# Altium schematic symbol library jlcpcb_2025_04_capacitors_extended_0805.schlib: 3281 symbols (part 17 of 18) (continued)
## TCC0805X5R395K250FT
designator C?  Capacitance: 3.9uF  (hidden comment: *)
Capacitor, Ceramic (MLCC), 3.9uF, ±10%, 25V, X5R, ±10%, SMD 0805; Manufacturer: CCTC; Manufacturer Part Number: TCC0805X5R395K250FT; Package Size: 0805; JLCPCB Basic Part: No; JLCPCB Part Number: C7393929; Supplier 1: LCSC; Category: Capacitors - MLCC; Supplier Part Number 1: C7393929; Tolerance: ±10%; Voltage Rating: 25V; Temperature Coefficient: X5R; RoHS: Yes; ComponentLink1Description: Datasheet; ComponentLink1URL: https://wmsc.lcsc.com/wmsc/upload/file/pdf/v2/lcsc/2306211554_CCTC-TCC0805X5R395K250FT_C7393929.pdf; ComponentLink2Description: JLCPCB Part URL; ComponentLink2URL: https://jlcpcb.com/partdetail/C7393929; ComponentLink3Description: LCSC Part URL; ComponentLink3URL: https://lcsc.com/product-detail/Multilayer-Ceramic-Capacitors-MLCC---SMD-SMT_CCTC-CCTC-TCC0805X5R395K250FT_C7393929.html
footprint CAP-0805 (0805 (2012M) Capacitor)
pins: 1, 2

## TCC0805X5R475K100FT
designator C?  Capacitance: 4.7uF  (hidden comment: *)
Capacitor, Ceramic (MLCC), 4.7uF, ±10%, 10V, X5R, ±10%, SMD 0805; Manufacturer: CCTC; Manufacturer Part Number: TCC0805X5R475K100FT; Package Size: 0805; JLCPCB Basic Part: No; JLCPCB Part Number: C380341; Supplier 1: LCSC; Category: Capacitors - MLCC; Supplier Part Number 1: C380341; Tolerance: ±10%; Voltage Rating: 10V; Temperature Coefficient: X5R; RoHS: Yes; ComponentLink1Description: Datasheet; ComponentLink1URL: https://wmsc.lcsc.com/wmsc/upload/file/pdf/v2/lcsc/2304140030_CCTC-TCC0805X5R475K100FT_C380341.pdf; ComponentLink2Description: JLCPCB Part URL; ComponentLink2URL: https://jlcpcb.com/partdetail/C380341; ComponentLink3Description: LCSC Part URL; ComponentLink3URL: https://lcsc.com/product-detail/Multilayer-Ceramic-Capacitors-MLCC---SMD-SMT_CCTC-CCTC-TCC0805X5R475K100FT_C380341.html
footprint CAP-0805 (0805 (2012M) Capacitor)
pins: 1, 2

## TCC0805X5R475K160FT
designator C?  Capacitance: 4.7uF  (hidden comment: *)
Capacitor, Ceramic (MLCC), 4.7uF, ±10%, 16V, X5R, ±10%, SMD 0805; Manufacturer: CCTC; Manufacturer Part Number: TCC0805X5R475K160FT; Package Size: 0805; JLCPCB Basic Part: No; JLCPCB Part Number: C380342; Supplier 1: LCSC; Category: Capacitors - MLCC; Supplier Part Number 1: C380342; Tolerance: ±10%; Voltage Rating: 16V; Temperature Coefficient: X5R; RoHS: Yes; ComponentLink1Description: Datasheet; ComponentLink1URL: https://wmsc.lcsc.com/wmsc/upload/file/pdf/v2/lcsc/2304140030_CCTC-TCC0805X5R475K160FT_C380342.pdf; ComponentLink2Description: JLCPCB Part URL; ComponentLink2URL: https://jlcpcb.com/partdetail/C380342; ComponentLink3Description: LCSC Part URL; ComponentLink3URL: https://lcsc.com/product-detail/Multilayer-Ceramic-Capacitors-MLCC---SMD-SMT_CCTC-CCTC-TCC0805X5R475K160FT_C380342.html
footprint CAP-0805 (0805 (2012M) Capacitor)
pins: 1, 2

## TCC0805X5R475K250FT
designator C?  Capacitance: 4.7uF  (hidden comment: *)
Capacitor, Ceramic (MLCC), 4.7uF, ±10%, 25V, X5R, ±10%, SMD 0805; Manufacturer: CCTC; Manufacturer Part Number: TCC0805X5R475K250FT; Package Size: 0805; JLCPCB Basic Part: No; JLCPCB Part Number: C380343; Supplier 1: LCSC; Category: Capacitors - MLCC; Supplier Part Number 1: C380343; Tolerance: ±10%; Voltage Rating: 25V; Temperature Coefficient: X5R; RoHS: Yes; ComponentLink1Description: Datasheet; ComponentLink1URL: https://wmsc.lcsc.com/wmsc/upload/file/pdf/v2/lcsc/2304140030_CCTC-TCC0805X5R475K250FT_C380343.pdf; ComponentLink2Description: JLCPCB Part URL; ComponentLink2URL: https://jlcpcb.com/partdetail/C380343; ComponentLink3Description: LCSC Part URL; ComponentLink3URL: https://lcsc.com/product-detail/Multilayer-Ceramic-Capacitors-MLCC---SMD-SMT_CCTC-CCTC-TCC0805X5R475K250FT_C380343.html
footprint CAP-0805 (0805 (2012M) Capacitor)
pins: 1, 2

## TCC0805X5R475K500FT
designator C?  Capacitance: 4.7uF  (hidden comment: *)
Capacitor, Ceramic (MLCC), 4.7uF, ±10%, 50V, X5R, ±10%, SMD 0805; Manufacturer: CCTC; Manufacturer Part Number: TCC0805X5R475K500FT; Package Size: 0805; JLCPCB Basic Part: No; JLCPCB Part Number: C2903668; Supplier 1: LCSC; Category: Capacitors - MLCC; Supplier Part Number 1: C2903668; Tolerance: ±10%; Voltage Rating: 50V; Temperature Coefficient: X5R; RoHS: Yes; ComponentLink1Description: Datasheet; ComponentLink1URL: https://wmsc.lcsc.com/wmsc/upload/file/pdf/v2/lcsc/2110101130_CCTC-TCC0805X5R475K500FT_C2903668.pdf; ComponentLink2Description: JLCPCB Part URL; ComponentLink2URL: https://jlcpcb.com/partdetail/C2903668; ComponentLink3Description: LCSC Part URL; ComponentLink3URL: https://lcsc.com/product-detail/Multilayer-Ceramic-Capacitors-MLCC---SMD-SMT_CCTC-CCTC-TCC0805X5R475K500FT_C2903668.html
footprint CAP-0805 (0805 (2012M) Capacitor)
pins: 1, 2

## TCC0805X5R475M250FT
designator C?  Capacitance: 4.7uF  (hidden comment: *)
Capacitor, Ceramic (MLCC), 4.7uF, ±20%, 25V, X5R, ±20%, SMD 0805; Manufacturer: CCTC; Manufacturer Part Number: TCC0805X5R475M250FT; Package Size: 0805; JLCPCB Basic Part: No; JLCPCB Part Number: C5375826; Supplier 1: LCSC; Category: Capacitors - MLCC; Supplier Part Number 1: C5375826; Tolerance: ±20%; Voltage Rating: 25V; Temperature Coefficient: X5R; RoHS: Yes; ComponentLink1Description: Datasheet; ComponentLink2Description: JLCPCB Part URL; ComponentLink2URL: https://jlcpcb.com/partdetail/C5375826; ComponentLink3Description: LCSC Part URL; ComponentLink3URL: https://lcsc.com/product-detail/Multilayer-Ceramic-Capacitors-MLCC---SMD-SMT_CCTC-CCTC-TCC0805X5R475M250FT_C5375826.html
footprint CAP-0805 (0805 (2012M) Capacitor)
pins: 1, 2

## TCC0805X5R475M500FT
designator C?  Capacitance: 4.7uF  (hidden comment: *)
Capacitor, Ceramic (MLCC), 4.7uF, ±20%, 50V, X5R, ±20%, SMD 0805; Manufacturer: CCTC; Manufacturer Part Number: TCC0805X5R475M500FT; Package Size: 0805; JLCPCB Basic Part: No; JLCPCB Part Number: C7393930; Supplier 1: LCSC; Category: Capacitors - MLCC; Supplier Part Number 1: C7393930; Tolerance: ±20%; Voltage Rating: 50V; Temperature Coefficient: X5R; RoHS: Yes; ComponentLink1Description: Datasheet; ComponentLink1URL: https://wmsc.lcsc.com/wmsc/upload/file/pdf/v2/lcsc/2306211554_CCTC-TCC0805X5R475M500FT_C7393930.pdf; ComponentLink2Description: JLCPCB Part URL; ComponentLink2URL: https://jlcpcb.com/partdetail/C7393930; ComponentLink3Description: LCSC Part URL; ComponentLink3URL: https://lcsc.com/product-detail/Multilayer-Ceramic-Capacitors-MLCC---SMD-SMT_CCTC-CCTC-TCC0805X5R475M500FT_C7393930.html
footprint CAP-0805 (0805 (2012M) Capacitor)
pins: 1, 2

## TCC0805X7R101K500BT
designator C?  Capacitance: 100pF  (hidden comment: *)
Capacitor, Ceramic (MLCC), 100pF, ±10%, 50V, X7R, ±10%, SMD 0805; Manufacturer: CCTC; Manufacturer Part Number: TCC0805X7R101K500BT; Package Size: 0805; JLCPCB Basic Part: No; JLCPCB Part Number: C376914; Supplier 1: LCSC; Category: Capacitors - MLCC; Supplier Part Number 1: C376914; Tolerance: ±10%; Voltage Rating: 50V; Temperature Coefficient: X7R; RoHS: Yes; ComponentLink1Description: Datasheet; ComponentLink1URL: https://wmsc.lcsc.com/wmsc/upload/file/pdf/v2/lcsc/2304140030_CCTC-TCC0805X7R101K500BT_C376914.pdf; ComponentLink2Description: JLCPCB Part URL; ComponentLink2URL: https://jlcpcb.com/partdetail/C376914; ComponentLink3Description: LCSC Part URL; ComponentLink3URL: https://lcsc.com/product-detail/Multilayer-Ceramic-Capacitors-MLCC---SMD-SMT_CCTC-CCTC-TCC0805X7R101K500BT_C376914.html
footprint CAP-0805 (0805 (2012M) Capacitor)
pins: 1, 2

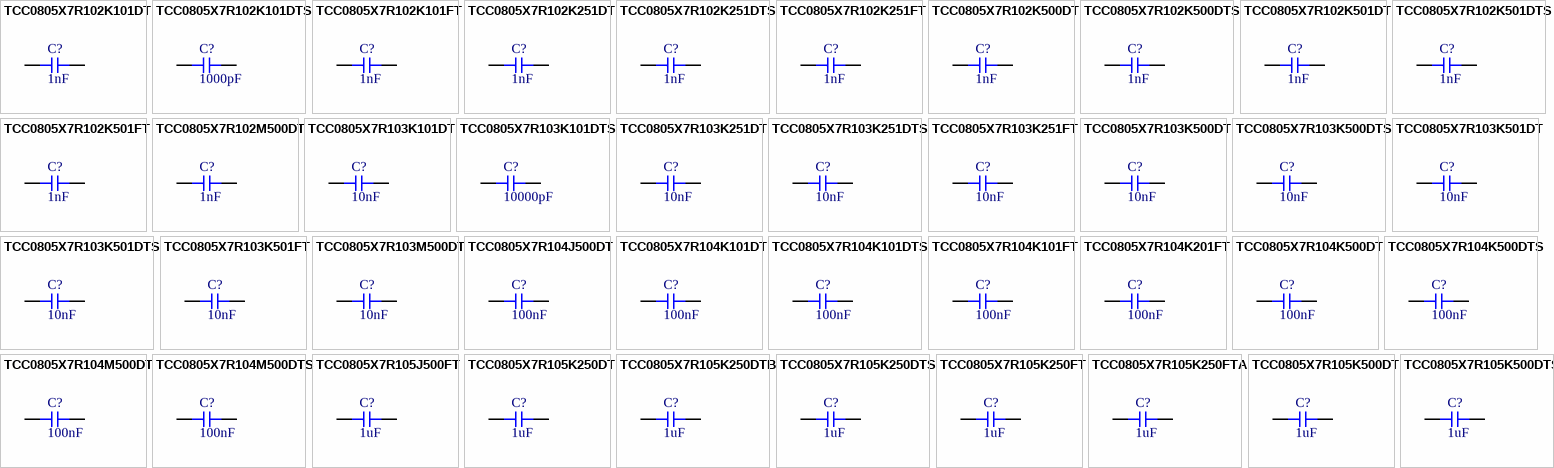
[diagram p76: symbols TCC0805X7R102K101DT to TCC0805X7R105K500DTS]

## TCC0805X7R102K101DT
designator C?  Capacitance: 1nF  (hidden comment: *)
Capacitor, Ceramic (MLCC), 1nF, ±10%, 100V, X7R, ±10%, SMD 0805; Manufacturer: CCTC; Manufacturer Part Number: TCC0805X7R102K101DT; Package Size: 0805; JLCPCB Basic Part: No; JLCPCB Part Number: C282718; Supplier 1: LCSC; Category: Capacitors - MLCC; Supplier Part Number 1: C282718; Tolerance: ±10%; Voltage Rating: 100V; Temperature Coefficient: X7R; RoHS: Yes; ComponentLink1Description: Datasheet; ComponentLink1URL: https://wmsc.lcsc.com/wmsc/upload/file/pdf/v2/lcsc/2304140030_CCTC-TCC0805X7R102K101DT_C282718.pdf; ComponentLink2Description: JLCPCB Part URL; ComponentLink2URL: https://jlcpcb.com/partdetail/C282718; ComponentLink3Description: LCSC Part URL; ComponentLink3URL: https://lcsc.com/product-detail/Multilayer-Ceramic-Capacitors-MLCC---SMD-SMT_CCTC-CCTC-TCC0805X7R102K101DT_C282718.html
footprint CAP-0805 (0805 (2012M) Capacitor)
pins: 1, 2

## TCC0805X7R102K101DTS
designator C?  Capacitance: 1000pF  (hidden comment: *)
Capacitor, Ceramic (MLCC), 1000pF, ±10%, 100V, X7R, ±10%, SMD 0805; Manufacturer: CCTC; Manufacturer Part Number: TCC0805X7R102K101DTS; Package Size: 0805; JLCPCB Basic Part: No; JLCPCB Part Number: C880639; Supplier 1: LCSC; Category: Capacitors - MLCC; Supplier Part Number 1: C880639; Tolerance: ±10%; Voltage Rating: 100V; Temperature Coefficient: X7R; RoHS: Yes; ComponentLink1Description: Datasheet; ComponentLink1URL: https://wmsc.lcsc.com/wmsc/upload/file/pdf/v2/lcsc/2304140030_CCTC-TCC0805X7R102K101DTS_C880639.pdf; ComponentLink2Description: JLCPCB Part URL; ComponentLink2URL: https://jlcpcb.com/partdetail/C880639; ComponentLink3Description: LCSC Part URL; ComponentLink3URL: https://lcsc.com/product-detail/Multilayer-Ceramic-Capacitors-MLCC---SMD-SMT_CCTC-CCTC-TCC0805X7R102K101DTS_C880639.html
footprint CAP-0805 (0805 (2012M) Capacitor)
pins: 1, 2

## TCC0805X7R102K101FT
designator C?  Capacitance: 1nF  (hidden comment: *)
Capacitor, Ceramic (MLCC), 1nF, ±10%, 100V, X7R, ±10%, SMD 0805; Manufacturer: CCTC; Manufacturer Part Number: TCC0805X7R102K101FT; Package Size: 0805; JLCPCB Basic Part: No; JLCPCB Part Number: C282719; Supplier 1: LCSC; Category: Capacitors - MLCC; Supplier Part Number 1: C282719; Tolerance: ±10%; Voltage Rating: 100V; Temperature Coefficient: X7R; RoHS: Yes; ComponentLink1Description: Datasheet; ComponentLink1URL: https://wmsc.lcsc.com/wmsc/upload/file/pdf/v2/lcsc/2304140030_CCTC-TCC0805X7R102K101FT_C282719.pdf; ComponentLink2Description: JLCPCB Part URL; ComponentLink2URL: https://jlcpcb.com/partdetail/C282719; ComponentLink3Description: LCSC Part URL; ComponentLink3URL: https://lcsc.com/product-detail/Multilayer-Ceramic-Capacitors-MLCC---SMD-SMT_CCTC-CCTC-TCC0805X7R102K101FT_C282719.html
footprint CAP-0805 (0805 (2012M) Capacitor)
pins: 1, 2

## TCC0805X7R102K251DT
designator C?  Capacitance: 1nF  (hidden comment: *)
Capacitor, Ceramic (MLCC), 1nF, ±10%, 250V, X7R, ±10%, SMD 0805; Manufacturer: CCTC; Manufacturer Part Number: TCC0805X7R102K251DT; Package Size: 0805; JLCPCB Basic Part: No; JLCPCB Part Number: C282720; Supplier 1: LCSC; Category: Capacitors - MLCC; Supplier Part Number 1: C282720; Tolerance: ±10%; Voltage Rating: 250V; Temperature Coefficient: X7R; RoHS: Yes; ComponentLink1Description: Datasheet; ComponentLink1URL: https://wmsc.lcsc.com/wmsc/upload/file/pdf/v2/lcsc/2304140030_CCTC-TCC0805X7R102K251DT_C282720.pdf; ComponentLink2Description: JLCPCB Part URL; ComponentLink2URL: https://jlcpcb.com/partdetail/C282720; ComponentLink3Description: LCSC Part URL; ComponentLink3URL: https://lcsc.com/product-detail/Multilayer-Ceramic-Capacitors-MLCC---SMD-SMT_CCTC-CCTC-TCC0805X7R102K251DT_C282720.html
footprint CAP-0805 (0805 (2012M) Capacitor)
pins: 1, 2

## TCC0805X7R102K251DTS
designator C?  Capacitance: 1nF  (hidden comment: *)
Capacitor, Ceramic (MLCC), 1nF, ±10%, 250V, X7R, ±10%, SMD 0805; Manufacturer: CCTC; Manufacturer Part Number: TCC0805X7R102K251DTS; Package Size: 0805; JLCPCB Basic Part: No; JLCPCB Part Number: C309045; Supplier 1: LCSC; Category: Capacitors - MLCC; Supplier Part Number 1: C309045; Tolerance: ±10%; Voltage Rating: 250V; Temperature Coefficient: X7R; RoHS: Yes; ComponentLink1Description: Datasheet; ComponentLink1URL: https://wmsc.lcsc.com/wmsc/upload/file/pdf/v2/lcsc/2304140030_CCTC-TCC0805X7R102K251DTS_C309045.pdf; ComponentLink2Description: JLCPCB Part URL; ComponentLink2URL: https://jlcpcb.com/partdetail/C309045; ComponentLink3Description: LCSC Part URL; ComponentLink3URL: https://lcsc.com/product-detail/Multilayer-Ceramic-Capacitors-MLCC---SMD-SMT_CCTC-CCTC-TCC0805X7R102K251DTS_C309045.html
footprint CAP-0805 (0805 (2012M) Capacitor)
pins: 1, 2

## TCC0805X7R102K251FT
designator C?  Capacitance: 1nF  (hidden comment: *)
Capacitor, Ceramic (MLCC), 1nF, ±10%, 250V, X7R, ±10%, SMD 0805; Manufacturer: CCTC; Manufacturer Part Number: TCC0805X7R102K251FT; Package Size: 0805; JLCPCB Basic Part: No; JLCPCB Part Number: C376916; Supplier 1: LCSC; Category: Capacitors - MLCC; Supplier Part Number 1: C376916; Tolerance: ±10%; Voltage Rating: 250V; Temperature Coefficient: X7R; RoHS: Yes; ComponentLink1Description: Datasheet; ComponentLink1URL: https://wmsc.lcsc.com/wmsc/upload/file/pdf/v2/lcsc/2304140030_CCTC-TCC0805X7R102K251FT_C376916.pdf; ComponentLink2Description: JLCPCB Part URL; ComponentLink2URL: https://jlcpcb.com/partdetail/C376916; ComponentLink3Description: LCSC Part URL; ComponentLink3URL: https://lcsc.com/product-detail/Multilayer-Ceramic-Capacitors-MLCC---SMD-SMT_CCTC-CCTC-TCC0805X7R102K251FT_C376916.html
footprint CAP-0805 (0805 (2012M) Capacitor)
pins: 1, 2

## TCC0805X7R102K500DT
designator C?  Capacitance: 1nF  (hidden comment: *)
Capacitor, Ceramic (MLCC), 1nF, ±10%, 50V, X7R, ±10%, SMD 0805; Manufacturer: CCTC; Manufacturer Part Number: TCC0805X7R102K500DT; Package Size: 0805; JLCPCB Basic Part: No; JLCPCB Part Number: C282721; Supplier 1: LCSC; Category: Capacitors - MLCC; Supplier Part Number 1: C282721; Tolerance: ±10%; Voltage Rating: 50V; Temperature Coefficient: X7R; RoHS: Yes; ComponentLink1Description: Datasheet; ComponentLink1URL: https://wmsc.lcsc.com/wmsc/upload/file/pdf/v2/lcsc/2304140030_CCTC-TCC0805X7R102K500DT_C282721.pdf; ComponentLink2Description: JLCPCB Part URL; ComponentLink2URL: https://jlcpcb.com/partdetail/C282721; ComponentLink3Description: LCSC Part URL; ComponentLink3URL: https://lcsc.com/product-detail/Multilayer-Ceramic-Capacitors-MLCC---SMD-SMT_CCTC-CCTC-TCC0805X7R102K500DT_C282721.html
footprint CAP-0805 (0805 (2012M) Capacitor)
pins: 1, 2

## TCC0805X7R102K500DTS
designator C?  Capacitance: 1nF  (hidden comment: *)
Capacitor, Ceramic (MLCC), 1nF, ±10%, 50V, X7R, ±10%, SMD 0805; Manufacturer: CCTC; Manufacturer Part Number: TCC0805X7R102K500DTS; Package Size: 0805; JLCPCB Basic Part: No; JLCPCB Part Number: C376917; Supplier 1: LCSC; Category: Capacitors - MLCC; Supplier Part Number 1: C376917; Tolerance: ±10%; Voltage Rating: 50V; Temperature Coefficient: X7R; RoHS: Yes; ComponentLink1Description: Datasheet; ComponentLink1URL: https://wmsc.lcsc.com/wmsc/upload/file/pdf/v2/lcsc/2304140030_CCTC-TCC0805X7R102K500DTS_C376917.pdf; ComponentLink2Description: JLCPCB Part URL; ComponentLink2URL: https://jlcpcb.com/partdetail/C376917; ComponentLink3Description: LCSC Part URL; ComponentLink3URL: https://lcsc.com/product-detail/Multilayer-Ceramic-Capacitors-MLCC---SMD-SMT_CCTC-CCTC-TCC0805X7R102K500DTS_C376917.html
footprint CAP-0805 (0805 (2012M) Capacitor)
pins: 1, 2

## TCC0805X7R102K501DT
designator C?  Capacitance: 1nF  (hidden comment: *)
Capacitor, Ceramic (MLCC), 1nF, ±10%, 500V, X7R, ±10%, SMD 0805; Manufacturer: CCTC; Manufacturer Part Number: TCC0805X7R102K501DT; Package Size: 0805; JLCPCB Basic Part: No; JLCPCB Part Number: C282722; Supplier 1: LCSC; Category: Capacitors - MLCC; Supplier Part Number 1: C282722; Tolerance: ±10%; Voltage Rating: 500V; Temperature Coefficient: X7R; RoHS: Yes; ComponentLink1Description: Datasheet; ComponentLink1URL: https://wmsc.lcsc.com/wmsc/upload/file/pdf/v2/lcsc/2304140030_CCTC-TCC0805X7R102K501DT_C282722.pdf; ComponentLink2Description: JLCPCB Part URL; ComponentLink2URL: https://jlcpcb.com/partdetail/C282722; ComponentLink3Description: LCSC Part URL; ComponentLink3URL: https://lcsc.com/product-detail/Multilayer-Ceramic-Capacitors-MLCC---SMD-SMT_CCTC-CCTC-TCC0805X7R102K501DT_C282722.html
footprint CAP-0805 (0805 (2012M) Capacitor)
pins: 1, 2

## TCC0805X7R102K501DTS
designator C?  Capacitance: 1nF  (hidden comment: *)
Capacitor, Ceramic (MLCC), 1nF, ±10%, 500V, X7R, ±10%, SMD 0805; Manufacturer: CCTC; Manufacturer Part Number: TCC0805X7R102K501DTS; Package Size: 0805; JLCPCB Basic Part: No; JLCPCB Part Number: C309046; Supplier 1: LCSC; Category: Capacitors - MLCC; Supplier Part Number 1: C309046; Tolerance: ±10%; Voltage Rating: 500V; Temperature Coefficient: X7R; RoHS: Yes; ComponentLink1Description: Datasheet; ComponentLink1URL: https://wmsc.lcsc.com/wmsc/upload/file/pdf/v2/lcsc/2304140030_CCTC-TCC0805X7R102K501DTS_C309046.pdf; ComponentLink2Description: JLCPCB Part URL; ComponentLink2URL: https://jlcpcb.com/partdetail/C309046; ComponentLink3Description: LCSC Part URL; ComponentLink3URL: https://lcsc.com/product-detail/Multilayer-Ceramic-Capacitors-MLCC---SMD-SMT_CCTC-CCTC-TCC0805X7R102K501DTS_C309046.html
footprint CAP-0805 (0805 (2012M) Capacitor)
pins: 1, 2

## TCC0805X7R102K501FT
designator C?  Capacitance: 1nF  (hidden comment: *)
Capacitor, Ceramic (MLCC), 1nF, ±10%, 500V, X7R, ±10%, SMD 0805; Manufacturer: CCTC; Manufacturer Part Number: TCC0805X7R102K501FT; Package Size: 0805; JLCPCB Basic Part: No; JLCPCB Part Number: C282723; Supplier 1: LCSC; Category: Capacitors - MLCC; Supplier Part Number 1: C282723; Tolerance: ±10%; Voltage Rating: 500V; Temperature Coefficient: X7R; RoHS: Yes; ComponentLink1Description: Datasheet; ComponentLink1URL: https://wmsc.lcsc.com/wmsc/upload/file/pdf/v2/lcsc/2304140030_CCTC-TCC0805X7R102K501FT_C282723.pdf; ComponentLink2Description: JLCPCB Part URL; ComponentLink2URL: https://jlcpcb.com/partdetail/C282723; ComponentLink3Description: LCSC Part URL; ComponentLink3URL: https://lcsc.com/product-detail/Multilayer-Ceramic-Capacitors-MLCC---SMD-SMT_CCTC-CCTC-TCC0805X7R102K501FT_C282723.html
footprint CAP-0805 (0805 (2012M) Capacitor)
pins: 1, 2

## TCC0805X7R102M500DT
designator C?  Capacitance: 1nF  (hidden comment: *)
Capacitor, Ceramic (MLCC), 1nF, ±20%, 50V, X7R, ±20%, SMD 0805; Manufacturer: CCTC; Manufacturer Part Number: TCC0805X7R102M500DT; Package Size: 0805; JLCPCB Basic Part: No; JLCPCB Part Number: C713510; Supplier 1: LCSC; Category: Capacitors - MLCC; Supplier Part Number 1: C713510; Tolerance: ±20%; Voltage Rating: 50V; Temperature Coefficient: X7R; RoHS: Yes; ComponentLink1Description: Datasheet; ComponentLink1URL: https://wmsc.lcsc.com/wmsc/upload/file/pdf/v2/lcsc/2304140030_CCTC-TCC0805X7R102M500DT_C713510.pdf; ComponentLink2Description: JLCPCB Part URL; ComponentLink2URL: https://jlcpcb.com/partdetail/C713510; ComponentLink3Description: LCSC Part URL; ComponentLink3URL: https://lcsc.com/product-detail/Multilayer-Ceramic-Capacitors-MLCC---SMD-SMT_CCTC-CCTC-TCC0805X7R102M500DT_C713510.html
footprint CAP-0805 (0805 (2012M) Capacitor)
pins: 1, 2

## TCC0805X7R103K101DT
designator C?  Capacitance: 10nF  (hidden comment: *)
Capacitor, Ceramic (MLCC), 10nF, ±10%, 100V, X7R, ±10%, SMD 0805; Manufacturer: CCTC; Manufacturer Part Number: TCC0805X7R103K101DT; Package Size: 0805; JLCPCB Basic Part: No; JLCPCB Part Number: C282724; Supplier 1: LCSC; Category: Capacitors - MLCC; Supplier Part Number 1: C282724; Tolerance: ±10%; Voltage Rating: 100V; Temperature Coefficient: X7R; RoHS: Yes; ComponentLink1Description: Datasheet; ComponentLink1URL: https://wmsc.lcsc.com/wmsc/upload/file/pdf/v2/lcsc/2304140030_CCTC-TCC0805X7R103K101DT_C282724.pdf; ComponentLink2Description: JLCPCB Part URL; ComponentLink2URL: https://jlcpcb.com/partdetail/C282724; ComponentLink3Description: LCSC Part URL; ComponentLink3URL: https://lcsc.com/product-detail/Multilayer-Ceramic-Capacitors-MLCC---SMD-SMT_CCTC-CCTC-TCC0805X7R103K101DT_C282724.html
footprint CAP-0805 (0805 (2012M) Capacitor)
pins: 1, 2

## TCC0805X7R103K101DTS
designator C?  Capacitance: 10000pF  (hidden comment: *)
Capacitor, Ceramic (MLCC), 10000pF, ±10%, 100V, X7R, ±10%, SMD 0805; Manufacturer: CCTC; Manufacturer Part Number: TCC0805X7R103K101DTS; Package Size: 0805; JLCPCB Basic Part: No; JLCPCB Part Number: C880638; Supplier 1: LCSC; Category: Capacitors - MLCC; Supplier Part Number 1: C880638; Tolerance: ±10%; Voltage Rating: 100V; Temperature Coefficient: X7R; RoHS: Yes; ComponentLink1Description: Datasheet; ComponentLink1URL: https://wmsc.lcsc.com/wmsc/upload/file/pdf/v2/lcsc/2304140030_CCTC-TCC0805X7R103K101DTS_C880638.pdf; ComponentLink2Description: JLCPCB Part URL; ComponentLink2URL: https://jlcpcb.com/partdetail/C880638; ComponentLink3Description: LCSC Part URL; ComponentLink3URL: https://lcsc.com/product-detail/Multilayer-Ceramic-Capacitors-MLCC---SMD-SMT_CCTC-CCTC-TCC0805X7R103K101DTS_C880638.html
footprint CAP-0805 (0805 (2012M) Capacitor)
pins: 1, 2

## TCC0805X7R103K251DT
designator C?  Capacitance: 10nF  (hidden comment: *)
Capacitor, Ceramic (MLCC), 10nF, ±10%, 250V, X7R, ±10%, SMD 0805; Manufacturer: CCTC; Manufacturer Part Number: TCC0805X7R103K251DT; Package Size: 0805; JLCPCB Basic Part: No; JLCPCB Part Number: C282726; Supplier 1: LCSC; Category: Capacitors - MLCC; Supplier Part Number 1: C282726; Tolerance: ±10%; Voltage Rating: 250V; Temperature Coefficient: X7R; RoHS: Yes; ComponentLink1Description: Datasheet; ComponentLink1URL: https://wmsc.lcsc.com/wmsc/upload/file/pdf/v2/lcsc/2304140030_CCTC-TCC0805X7R103K251DT_C282726.pdf; ComponentLink2Description: JLCPCB Part URL; ComponentLink2URL: https://jlcpcb.com/partdetail/C282726; ComponentLink3Description: LCSC Part URL; ComponentLink3URL: https://lcsc.com/product-detail/Multilayer-Ceramic-Capacitors-MLCC---SMD-SMT_CCTC-CCTC-TCC0805X7R103K251DT_C282726.html
footprint CAP-0805 (0805 (2012M) Capacitor)
pins: 1, 2

## TCC0805X7R103K251DTS
designator C?  Capacitance: 10nF  (hidden comment: *)
Capacitor, Ceramic (MLCC), 10nF, ±10%, 250V, X7R, ±10%, SMD 0805; Manufacturer: CCTC; Manufacturer Part Number: TCC0805X7R103K251DTS; Package Size: 0805; JLCPCB Basic Part: No; JLCPCB Part Number: C282727; Supplier 1: LCSC; Category: Capacitors - MLCC; Supplier Part Number 1: C282727; Tolerance: ±10%; Voltage Rating: 250V; Temperature Coefficient: X7R; RoHS: Yes; ComponentLink1Description: Datasheet; ComponentLink1URL: https://wmsc.lcsc.com/wmsc/upload/file/pdf/v2/lcsc/2304140030_CCTC-TCC0805X7R103K251DTS_C282727.pdf; ComponentLink2Description: JLCPCB Part URL; ComponentLink2URL: https://jlcpcb.com/partdetail/C282727; ComponentLink3Description: LCSC Part URL; ComponentLink3URL: https://lcsc.com/product-detail/Multilayer-Ceramic-Capacitors-MLCC---SMD-SMT_CCTC-CCTC-TCC0805X7R103K251DTS_C282727.html
footprint CAP-0805 (0805 (2012M) Capacitor)
pins: 1, 2

## TCC0805X7R103K251FT
designator C?  Capacitance: 10nF  (hidden comment: *)
Capacitor, Ceramic (MLCC), 10nF, ±10%, 250V, X7R, ±10%, SMD 0805; Manufacturer: CCTC; Manufacturer Part Number: TCC0805X7R103K251FT; Package Size: 0805; JLCPCB Basic Part: No; JLCPCB Part Number: C376919; Supplier 1: LCSC; Category: Capacitors - MLCC; Supplier Part Number 1: C376919; Tolerance: ±10%; Voltage Rating: 250V; Temperature Coefficient: X7R; RoHS: Yes; ComponentLink1Description: Datasheet; ComponentLink1URL: https://wmsc.lcsc.com/wmsc/upload/file/pdf/v2/lcsc/2304140030_CCTC-TCC0805X7R103K251FT_C376919.pdf; ComponentLink2Description: JLCPCB Part URL; ComponentLink2URL: https://jlcpcb.com/partdetail/C376919; ComponentLink3Description: LCSC Part URL; ComponentLink3URL: https://lcsc.com/product-detail/Multilayer-Ceramic-Capacitors-MLCC---SMD-SMT_CCTC-CCTC-TCC0805X7R103K251FT_C376919.html
footprint CAP-0805 (0805 (2012M) Capacitor)
pins: 1, 2

## TCC0805X7R103K500DT
designator C?  Capacitance: 10nF  (hidden comment: *)
Capacitor, Ceramic (MLCC), 10nF, ±10%, 50V, X7R, ±10%, SMD 0805; Manufacturer: CCTC; Manufacturer Part Number: TCC0805X7R103K500DT; Package Size: 0805; JLCPCB Basic Part: No; JLCPCB Part Number: C282728; Supplier 1: LCSC; Category: Capacitors - MLCC; Supplier Part Number 1: C282728; Tolerance: ±10%; Voltage Rating: 50V; Temperature Coefficient: X7R; RoHS: Yes; ComponentLink1Description: Datasheet; ComponentLink1URL: https://wmsc.lcsc.com/wmsc/upload/file/pdf/v2/lcsc/2304140030_CCTC-TCC0805X7R103K500DT_C282728.pdf; ComponentLink2Description: JLCPCB Part URL; ComponentLink2URL: https://jlcpcb.com/partdetail/C282728; ComponentLink3Description: LCSC Part URL; ComponentLink3URL: https://lcsc.com/product-detail/Multilayer-Ceramic-Capacitors-MLCC---SMD-SMT_CCTC-CCTC-TCC0805X7R103K500DT_C282728.html
footprint CAP-0805 (0805 (2012M) Capacitor)
pins: 1, 2

## TCC0805X7R103K500DTS
designator C?  Capacitance: 10nF  (hidden comment: *)
Capacitor, Ceramic (MLCC), 10nF, ±10%, 50V, X7R, ±10%, SMD 0805; Manufacturer: CCTC; Manufacturer Part Number: TCC0805X7R103K500DTS; Package Size: 0805; JLCPCB Basic Part: No; JLCPCB Part Number: C376920; Supplier 1: LCSC; Category: Capacitors - MLCC; Supplier Part Number 1: C376920; Tolerance: ±10%; Voltage Rating: 50V; Temperature Coefficient: X7R; RoHS: Yes; ComponentLink1Description: Datasheet; ComponentLink1URL: https://wmsc.lcsc.com/wmsc/upload/file/pdf/v2/lcsc/2304140030_CCTC-TCC0805X7R103K500DTS_C376920.pdf; ComponentLink2Description: JLCPCB Part URL; ComponentLink2URL: https://jlcpcb.com/partdetail/C376920; ComponentLink3Description: LCSC Part URL; ComponentLink3URL: https://lcsc.com/product-detail/Multilayer-Ceramic-Capacitors-MLCC---SMD-SMT_CCTC-CCTC-TCC0805X7R103K500DTS_C376920.html
footprint CAP-0805 (0805 (2012M) Capacitor)
pins: 1, 2

## TCC0805X7R103K501DT
designator C?  Capacitance: 10nF  (hidden comment: *)
Capacitor, Ceramic (MLCC), 10nF, ±10%, 500V, X7R, ±10%, SMD 0805; Manufacturer: CCTC; Manufacturer Part Number: TCC0805X7R103K501DT; Package Size: 0805; JLCPCB Basic Part: No; JLCPCB Part Number: C7393933; Supplier 1: LCSC; Category: Capacitors - MLCC; Supplier Part Number 1: C7393933; Tolerance: ±10%; Voltage Rating: 500V; Temperature Coefficient: X7R; RoHS: Yes; ComponentLink1Description: Datasheet; ComponentLink1URL: https://wmsc.lcsc.com/wmsc/upload/file/pdf/v2/lcsc/2306211554_CCTC-TCC0805X7R103K501DT_C7393933.pdf; ComponentLink2Description: JLCPCB Part URL; ComponentLink2URL: https://jlcpcb.com/partdetail/C7393933; ComponentLink3Description: LCSC Part URL; ComponentLink3URL: https://lcsc.com/product-detail/Multilayer-Ceramic-Capacitors-MLCC---SMD-SMT_CCTC-CCTC-TCC0805X7R103K501DT_C7393933.html
footprint CAP-0805 (0805 (2012M) Capacitor)
pins: 1, 2

## TCC0805X7R103K501DTS
designator C?  Capacitance: 10nF  (hidden comment: *)
Capacitor, Ceramic (MLCC), 10nF, ±10%, 500V, X7R, ±10%, SMD 0805; Manufacturer: CCTC; Manufacturer Part Number: TCC0805X7R103K501DTS; Package Size: 0805; JLCPCB Basic Part: No; JLCPCB Part Number: C309038; Supplier 1: LCSC; Category: Capacitors - MLCC; Supplier Part Number 1: C309038; Tolerance: ±10%; Voltage Rating: 500V; Temperature Coefficient: X7R; RoHS: Yes; ComponentLink1Description: Datasheet; ComponentLink1URL: https://wmsc.lcsc.com/wmsc/upload/file/pdf/v2/lcsc/2304140030_CCTC-TCC0805X7R103K501DTS_C309038.pdf; ComponentLink2Description: JLCPCB Part URL; ComponentLink2URL: https://jlcpcb.com/partdetail/C309038; ComponentLink3Description: LCSC Part URL; ComponentLink3URL: https://lcsc.com/product-detail/Multilayer-Ceramic-Capacitors-MLCC---SMD-SMT_CCTC-CCTC-TCC0805X7R103K501DTS_C309038.html
footprint CAP-0805 (0805 (2012M) Capacitor)
pins: 1, 2

## TCC0805X7R103K501FT
designator C?  Capacitance: 10nF  (hidden comment: *)
Capacitor, Ceramic (MLCC), 10nF, ±10%, 500V, X7R, ±10%, SMD 0805; Manufacturer: CCTC; Manufacturer Part Number: TCC0805X7R103K501FT; Package Size: 0805; JLCPCB Basic Part: No; JLCPCB Part Number: C282729; Supplier 1: LCSC; Category: Capacitors - MLCC; Supplier Part Number 1: C282729; Tolerance: ±10%; Voltage Rating: 500V; Temperature Coefficient: X7R; RoHS: Yes; ComponentLink1Description: Datasheet; ComponentLink1URL: https://wmsc.lcsc.com/wmsc/upload/file/pdf/v2/lcsc/2304140030_CCTC-TCC0805X7R103K501FT_C282729.pdf; ComponentLink2Description: JLCPCB Part URL; ComponentLink2URL: https://jlcpcb.com/partdetail/C282729; ComponentLink3Description: LCSC Part URL; ComponentLink3URL: https://lcsc.com/product-detail/Multilayer-Ceramic-Capacitors-MLCC---SMD-SMT_CCTC-CCTC-TCC0805X7R103K501FT_C282729.html
footprint CAP-0805 (0805 (2012M) Capacitor)
pins: 1, 2

## TCC0805X7R103M500DT
designator C?  Capacitance: 10nF  (hidden comment: *)
Capacitor, Ceramic (MLCC), 10nF, ±20%, 50V, X7R, ±20%, SMD 0805; Manufacturer: CCTC; Manufacturer Part Number: TCC0805X7R103M500DT; Package Size: 0805; JLCPCB Basic Part: No; JLCPCB Part Number: C376921; Supplier 1: LCSC; Category: Capacitors - MLCC; Supplier Part Number 1: C376921; Tolerance: ±20%; Voltage Rating: 50V; Temperature Coefficient: X7R; RoHS: Yes; ComponentLink1Description: Datasheet; ComponentLink1URL: https://wmsc.lcsc.com/wmsc/upload/file/pdf/v2/lcsc/2304140030_CCTC-TCC0805X7R103M500DT_C376921.pdf; ComponentLink2Description: JLCPCB Part URL; ComponentLink2URL: https://jlcpcb.com/partdetail/C376921; ComponentLink3Description: LCSC Part URL; ComponentLink3URL: https://lcsc.com/product-detail/Multilayer-Ceramic-Capacitors-MLCC---SMD-SMT_CCTC-CCTC-TCC0805X7R103M500DT_C376921.html
footprint CAP-0805 (0805 (2012M) Capacitor)
pins: 1, 2

## TCC0805X7R104J500DT
designator C?  Capacitance: 100nF  (hidden comment: *)
Capacitor, Ceramic (MLCC), 100nF, ±5%, 50V, X7R, ±5%, SMD 0805; Manufacturer: CCTC; Manufacturer Part Number: TCC0805X7R104J500DT; Package Size: 0805; JLCPCB Basic Part: No; JLCPCB Part Number: C282730; Supplier 1: LCSC; Category: Capacitors - MLCC; Supplier Part Number 1: C282730; Tolerance: ±5%; Voltage Rating: 50V; Temperature Coefficient: X7R; RoHS: Yes; ComponentLink1Description: Datasheet; ComponentLink1URL: https://wmsc.lcsc.com/wmsc/upload/file/pdf/v2/lcsc/2304140030_CCTC-TCC0805X7R104J500DT_C282730.pdf; ComponentLink2Description: JLCPCB Part URL; ComponentLink2URL: https://jlcpcb.com/partdetail/C282730; ComponentLink3Description: LCSC Part URL; ComponentLink3URL: https://lcsc.com/product-detail/Multilayer-Ceramic-Capacitors-MLCC---SMD-SMT_CCTC-CCTC-TCC0805X7R104J500DT_C282730.html
footprint CAP-0805 (0805 (2012M) Capacitor)
pins: 1, 2

## TCC0805X7R104K101DT
designator C?  Capacitance: 100nF  (hidden comment: *)
Capacitor, Ceramic (MLCC), 100nF, ±10%, 100V, X7R, ±10%, SMD 0805; Manufacturer: CCTC; Manufacturer Part Number: TCC0805X7R104K101DT; Package Size: 0805; JLCPCB Basic Part: No; JLCPCB Part Number: C344180; Supplier 1: LCSC; Category: Capacitors - MLCC; Supplier Part Number 1: C344180; Tolerance: ±10%; Voltage Rating: 100V; Temperature Coefficient: X7R; RoHS: Yes; ComponentLink1Description: Datasheet; ComponentLink1URL: https://wmsc.lcsc.com/wmsc/upload/file/pdf/v2/lcsc/2304140030_CCTC-TCC0805X7R104K101DT_C344180.pdf; ComponentLink2Description: JLCPCB Part URL; ComponentLink2URL: https://jlcpcb.com/partdetail/C344180; ComponentLink3Description: LCSC Part URL; ComponentLink3URL: https://lcsc.com/product-detail/Multilayer-Ceramic-Capacitors-MLCC---SMD-SMT_CCTC-CCTC-TCC0805X7R104K101DT_C344180.html
footprint CAP-0805 (0805 (2012M) Capacitor)
pins: 1, 2

## TCC0805X7R104K101DTS
designator C?  Capacitance: 100nF  (hidden comment: *)
Capacitor, Ceramic (MLCC), 100nF, ±10%, 100V, X7R, ±10%, SMD 0805; Manufacturer: CCTC; Manufacturer Part Number: TCC0805X7R104K101DTS; Package Size: 0805; JLCPCB Basic Part: No; JLCPCB Part Number: C376922; Supplier 1: LCSC; Category: Capacitors - MLCC; Supplier Part Number 1: C376922; Tolerance: ±10%; Voltage Rating: 100V; Temperature Coefficient: X7R; RoHS: Yes; ComponentLink1Description: Datasheet; ComponentLink1URL: https://wmsc.lcsc.com/wmsc/upload/file/pdf/v2/lcsc/2304140030_CCTC-TCC0805X7R104K101DTS_C376922.pdf; ComponentLink2Description: JLCPCB Part URL; ComponentLink2URL: https://jlcpcb.com/partdetail/C376922; ComponentLink3Description: LCSC Part URL; ComponentLink3URL: https://lcsc.com/product-detail/Multilayer-Ceramic-Capacitors-MLCC---SMD-SMT_CCTC-CCTC-TCC0805X7R104K101DTS_C376922.html
footprint CAP-0805 (0805 (2012M) Capacitor)
pins: 1, 2

## TCC0805X7R104K101FT
designator C?  Capacitance: 100nF  (hidden comment: *)
Capacitor, Ceramic (MLCC), 100nF, ±10%, 100V, X7R, ±10%, SMD 0805; Manufacturer: CCTC; Manufacturer Part Number: TCC0805X7R104K101FT; Package Size: 0805; JLCPCB Basic Part: No; JLCPCB Part Number: C282731; Supplier 1: LCSC; Category: Capacitors - MLCC; Supplier Part Number 1: C282731; Tolerance: ±10%; Voltage Rating: 100V; Temperature Coefficient: X7R; RoHS: Yes; ComponentLink1Description: Datasheet; ComponentLink1URL: https://wmsc.lcsc.com/wmsc/upload/file/pdf/v2/lcsc/2304140030_CCTC-TCC0805X7R104K101FT_C282731.pdf; ComponentLink2Description: JLCPCB Part URL; ComponentLink2URL: https://jlcpcb.com/partdetail/C282731; ComponentLink3Description: LCSC Part URL; ComponentLink3URL: https://lcsc.com/product-detail/Multilayer-Ceramic-Capacitors-MLCC---SMD-SMT_CCTC-CCTC-TCC0805X7R104K101FT_C282731.html
footprint CAP-0805 (0805 (2012M) Capacitor)
pins: 1, 2

## TCC0805X7R104K201FT
designator C?  Capacitance: 100nF  (hidden comment: *)
Capacitor, Ceramic (MLCC), 100nF, ±10%, 200V, X7R, ±10%, SMD 0805; Manufacturer: CCTC; Manufacturer Part Number: TCC0805X7R104K201FT; Package Size: 0805; JLCPCB Basic Part: No; JLCPCB Part Number: C5448894; Supplier 1: LCSC; Category: Capacitors - MLCC; Supplier Part Number 1: C5448894; Tolerance: ±10%; Voltage Rating: 200V; Temperature Coefficient: X7R; RoHS: Yes; ComponentLink1Description: Datasheet; ComponentLink1URL: https://wmsc.lcsc.com/wmsc/upload/file/pdf/v2/lcsc/2403281712_CCTC-TCC0805X7R104K201FT_C5448894.pdf; ComponentLink2Description: JLCPCB Part URL; ComponentLink2URL: https://jlcpcb.com/partdetail/C5448894; ComponentLink3Description: LCSC Part URL; ComponentLink3URL: https://lcsc.com/product-detail/Multilayer-Ceramic-Capacitors-MLCC---SMD-SMT_CCTC-CCTC-TCC0805X7R104K201FT_C5448894.html
footprint CAP-0805 (0805 (2012M) Capacitor)
pins: 1, 2

## TCC0805X7R104K500DT
designator C?  Capacitance: 100nF  (hidden comment: *)
Capacitor, Ceramic (MLCC), 100nF, ±10%, 50V, X7R, ±10%, SMD 0805; Manufacturer: CCTC; Manufacturer Part Number: TCC0805X7R104K500DT; Package Size: 0805; JLCPCB Basic Part: No; JLCPCB Part Number: C282732; Supplier 1: LCSC; Category: Capacitors - MLCC; Supplier Part Number 1: C282732; Tolerance: ±10%; Voltage Rating: 50V; Temperature Coefficient: X7R; RoHS: Yes; ComponentLink1Description: Datasheet; ComponentLink1URL: https://wmsc.lcsc.com/wmsc/upload/file/pdf/v2/lcsc/2304140030_CCTC-TCC0805X7R104K500DT_C282732.pdf; ComponentLink2Description: JLCPCB Part URL; ComponentLink2URL: https://jlcpcb.com/partdetail/C282732; ComponentLink3Description: LCSC Part URL; ComponentLink3URL: https://lcsc.com/product-detail/Multilayer-Ceramic-Capacitors-MLCC---SMD-SMT_CCTC-CCTC-TCC0805X7R104K500DT_C282732.html
footprint CAP-0805 (0805 (2012M) Capacitor)
pins: 1, 2

## TCC0805X7R104K500DTS
designator C?  Capacitance: 100nF  (hidden comment: *)
Capacitor, Ceramic (MLCC), 100nF, ±10%, 50V, X7R, ±10%, SMD 0805; Manufacturer: CCTC; Manufacturer Part Number: TCC0805X7R104K500DTS; Package Size: 0805; JLCPCB Basic Part: No; JLCPCB Part Number: C376924; Supplier 1: LCSC; Category: Capacitors - MLCC; Supplier Part Number 1: C376924; Tolerance: ±10%; Voltage Rating: 50V; Temperature Coefficient: X7R; RoHS: Yes; ComponentLink1Description: Datasheet; ComponentLink1URL: https://wmsc.lcsc.com/wmsc/upload/file/pdf/v2/lcsc/2304140030_CCTC-TCC0805X7R104K500DTS_C376924.pdf; ComponentLink2Description: JLCPCB Part URL; ComponentLink2URL: https://jlcpcb.com/partdetail/C376924; ComponentLink3Description: LCSC Part URL; ComponentLink3URL: https://lcsc.com/product-detail/Multilayer-Ceramic-Capacitors-MLCC---SMD-SMT_CCTC-CCTC-TCC0805X7R104K500DTS_C376924.html
footprint CAP-0805 (0805 (2012M) Capacitor)
pins: 1, 2

## TCC0805X7R104M500DT
designator C?  Capacitance: 100nF  (hidden comment: *)
Capacitor, Ceramic (MLCC), 100nF, ±20%, 50V, X7R, ±20%, SMD 0805; Manufacturer: CCTC; Manufacturer Part Number: TCC0805X7R104M500DT; Package Size: 0805; JLCPCB Basic Part: No; JLCPCB Part Number: C360619; Supplier 1: LCSC; Category: Capacitors - MLCC; Supplier Part Number 1: C360619; Tolerance: ±20%; Voltage Rating: 50V; Temperature Coefficient: X7R; RoHS: Yes; ComponentLink1Description: Datasheet; ComponentLink1URL: https://wmsc.lcsc.com/wmsc/upload/file/pdf/v2/lcsc/2304140030_CCTC-TCC0805X7R104M500DT_C360619.pdf; ComponentLink2Description: JLCPCB Part URL; ComponentLink2URL: https://jlcpcb.com/partdetail/C360619; ComponentLink3Description: LCSC Part URL; ComponentLink3URL: https://lcsc.com/product-detail/Multilayer-Ceramic-Capacitors-MLCC---SMD-SMT_CCTC-CCTC-TCC0805X7R104M500DT_C360619.html
footprint CAP-0805 (0805 (2012M) Capacitor)
pins: 1, 2

## TCC0805X7R104M500DTS
designator C?  Capacitance: 100nF  (hidden comment: *)
Capacitor, Ceramic (MLCC), 100nF, ±20%, 50V, ±20%, SMD 0805; Manufacturer: CCTC; Manufacturer Part Number: TCC0805X7R104M500DTS; Package Size: 0805; JLCPCB Basic Part: No; JLCPCB Part Number: C2682489; Supplier 1: LCSC; Category: Capacitors - MLCC; Supplier Part Number 1: C2682489; Tolerance: ±20%; Voltage Rating: 50V; RoHS: Yes; ComponentLink1Description: Datasheet; ComponentLink1URL: https://wmsc.lcsc.com/wmsc/upload/file/pdf/v2/lcsc/2106070437_CCTC-TCC0805X7R104M500DTS_C2682489.pdf; ComponentLink2Description: JLCPCB Part URL; ComponentLink2URL: https://jlcpcb.com/partdetail/C2682489; ComponentLink3Description: LCSC Part URL; ComponentLink3URL: https://lcsc.com/product-detail/Multilayer-Ceramic-Capacitors-MLCC---SMD-SMT_CCTC-CCTC-TCC0805X7R104M500DTS_C2682489.html
footprint CAP-0805 (0805 (2012M) Capacitor)
pins: 1, 2

## TCC0805X7R105J500FT
designator C?  Capacitance: 1uF  (hidden comment: *)
Capacitor, Ceramic (MLCC), 1uF, ±5%, 50V, X7R, ±5%, SMD 0805; Manufacturer: CCTC; Manufacturer Part Number: TCC0805X7R105J500FT; Package Size: 0805; JLCPCB Basic Part: No; JLCPCB Part Number: C20416457; Supplier 1: LCSC; Category: Capacitors - MLCC; Supplier Part Number 1: C20416457; Tolerance: ±5%; Voltage Rating: 50V; Temperature Coefficient: X7R; RoHS: Yes; ComponentLink1Description: Datasheet; ComponentLink1URL: https://wmsc.lcsc.com/wmsc/upload/file/pdf/v2/lcsc/2401051412_CCTC-TCC0805X7R105J500FT_C20416457.pdf; ComponentLink2Description: JLCPCB Part URL; ComponentLink2URL: https://jlcpcb.com/partdetail/C20416457; ComponentLink3Description: LCSC Part URL; ComponentLink3URL: https://lcsc.com/product-detail/Multilayer-Ceramic-Capacitors-MLCC---SMD-SMT_CCTC-CCTC-TCC0805X7R105J500FT_C20416457.html
footprint CAP-0805 (0805 (2012M) Capacitor)
pins: 1, 2

## TCC0805X7R105K250DT
designator C?  Capacitance: 1uF  (hidden comment: *)
Capacitor, Ceramic (MLCC), 1uF, ±10%, 25V, X7R, ±10%, SMD 0805; Manufacturer: CCTC; Manufacturer Part Number: TCC0805X7R105K250DT; Package Size: 0805; JLCPCB Basic Part: No; JLCPCB Part Number: C376925; Supplier 1: LCSC; Category: Capacitors - MLCC; Supplier Part Number 1: C376925; Tolerance: ±10%; Voltage Rating: 25V; Temperature Coefficient: X7R; RoHS: Yes; ComponentLink1Description: Datasheet; ComponentLink1URL: https://wmsc.lcsc.com/wmsc/upload/file/pdf/v2/lcsc/2304140030_CCTC-TCC0805X7R105K250DT_C376925.pdf; ComponentLink2Description: JLCPCB Part URL; ComponentLink2URL: https://jlcpcb.com/partdetail/C376925; ComponentLink3Description: LCSC Part URL; ComponentLink3URL: https://lcsc.com/product-detail/Multilayer-Ceramic-Capacitors-MLCC---SMD-SMT_CCTC-CCTC-TCC0805X7R105K250DT_C376925.html
footprint CAP-0805 (0805 (2012M) Capacitor)
pins: 1, 2

## TCC0805X7R105K250DTB
designator C?  Capacitance: 1uF  (hidden comment: *)
Capacitor, Ceramic (MLCC), 1uF, ±10%, 25V, X7R, ±10%, SMD 0805; Manufacturer: CCTC; Manufacturer Part Number: TCC0805X7R105K250DTB; Package Size: 0805; JLCPCB Basic Part: No; JLCPCB Part Number: C282733; Supplier 1: LCSC; Category: Capacitors - MLCC; Supplier Part Number 1: C282733; Tolerance: ±10%; Voltage Rating: 25V; Temperature Coefficient: X7R; RoHS: Yes; ComponentLink1Description: Datasheet; ComponentLink1URL: https://wmsc.lcsc.com/wmsc/upload/file/pdf/v2/lcsc/2304140030_CCTC-TCC0805X7R105K250DTB_C282733.pdf; ComponentLink2Description: JLCPCB Part URL; ComponentLink2URL: https://jlcpcb.com/partdetail/C282733; ComponentLink3Description: LCSC Part URL; ComponentLink3URL: https://lcsc.com/product-detail/Multilayer-Ceramic-Capacitors-MLCC---SMD-SMT_CCTC-CCTC-TCC0805X7R105K250DTB_C282733.html
footprint CAP-0805 (0805 (2012M) Capacitor)
pins: 1, 2

## TCC0805X7R105K250DTS
designator C?  Capacitance: 1uF  (hidden comment: *)
Capacitor, Ceramic (MLCC), 1uF, ±10%, 25V, X7R, ±10%, SMD 0805; Manufacturer: CCTC; Manufacturer Part Number: TCC0805X7R105K250DTS; Package Size: 0805; JLCPCB Basic Part: No; JLCPCB Part Number: C344171; Supplier 1: LCSC; Category: Capacitors - MLCC; Supplier Part Number 1: C344171; Tolerance: ±10%; Voltage Rating: 25V; Temperature Coefficient: X7R; RoHS: Yes; ComponentLink1Description: Datasheet; ComponentLink1URL: https://wmsc.lcsc.com/wmsc/upload/file/pdf/v2/lcsc/2304140030_CCTC-TCC0805X7R105K250DTS_C344171.pdf; ComponentLink2Description: JLCPCB Part URL; ComponentLink2URL: https://jlcpcb.com/partdetail/C344171; ComponentLink3Description: LCSC Part URL; ComponentLink3URL: https://lcsc.com/product-detail/Multilayer-Ceramic-Capacitors-MLCC---SMD-SMT_CCTC-CCTC-TCC0805X7R105K250DTS_C344171.html
footprint CAP-0805 (0805 (2012M) Capacitor)
pins: 1, 2

## TCC0805X7R105K250FT
designator C?  Capacitance: 1uF  (hidden comment: *)
Capacitor, Ceramic (MLCC), 1uF, ±10%, 25V, X7R, ±10%, SMD 0805; Manufacturer: CCTC; Manufacturer Part Number: TCC0805X7R105K250FT; Package Size: 0805; JLCPCB Basic Part: No; JLCPCB Part Number: C282734; Supplier 1: LCSC; Category: Capacitors - MLCC; Supplier Part Number 1: C282734; Tolerance: ±10%; Voltage Rating: 25V; Temperature Coefficient: X7R; RoHS: Yes; ComponentLink1Description: Datasheet; ComponentLink1URL: https://wmsc.lcsc.com/wmsc/upload/file/pdf/v2/lcsc/2304140030_CCTC-TCC0805X7R105K250FT_C282734.pdf; ComponentLink2Description: JLCPCB Part URL; ComponentLink2URL: https://jlcpcb.com/partdetail/C282734; ComponentLink3Description: LCSC Part URL; ComponentLink3URL: https://lcsc.com/product-detail/Multilayer-Ceramic-Capacitors-MLCC---SMD-SMT_CCTC-CCTC-TCC0805X7R105K250FT_C282734.html
footprint CAP-0805 (0805 (2012M) Capacitor)
pins: 1, 2

## TCC0805X7R105K250FTA
designator C?  Capacitance: 1uF  (hidden comment: *)
Capacitor, Ceramic (MLCC), 1uF, ±10%, 25V, X7R, ±10%, SMD 0805; Manufacturer: CCTC; Manufacturer Part Number: TCC0805X7R105K250FTA; Package Size: 0805; JLCPCB Basic Part: No; JLCPCB Part Number: C282735; Supplier 1: LCSC; Category: Capacitors - MLCC; Supplier Part Number 1: C282735; Tolerance: ±10%; Voltage Rating: 25V; Temperature Coefficient: X7R; RoHS: Yes; ComponentLink1Description: Datasheet; ComponentLink1URL: https://wmsc.lcsc.com/wmsc/upload/file/pdf/v2/lcsc/2304140030_CCTC-TCC0805X7R105K250FTA_C282735.pdf; ComponentLink2Description: JLCPCB Part URL; ComponentLink2URL: https://jlcpcb.com/partdetail/C282735; ComponentLink3Description: LCSC Part URL; ComponentLink3URL: https://lcsc.com/product-detail/Multilayer-Ceramic-Capacitors-MLCC---SMD-SMT_CCTC-CCTC-TCC0805X7R105K250FTA_C282735.html
footprint CAP-0805 (0805 (2012M) Capacitor)
pins: 1, 2

## TCC0805X7R105K500DT
designator C?  Capacitance: 1uF  (hidden comment: *)
Capacitor, Ceramic (MLCC), 1uF, ±10%, 50V, X7R, ±10%, SMD 0805; Manufacturer: CCTC; Manufacturer Part Number: TCC0805X7R105K500DT; Package Size: 0805; JLCPCB Basic Part: No; JLCPCB Part Number: C376926; Supplier 1: LCSC; Category: Capacitors - MLCC; Supplier Part Number 1: C376926; Tolerance: ±10%; Voltage Rating: 50V; Temperature Coefficient: X7R; RoHS: Yes; ComponentLink1Description: Datasheet; ComponentLink1URL: https://wmsc.lcsc.com/wmsc/upload/file/pdf/v2/lcsc/2304140030_CCTC-TCC0805X7R105K500DT_C376926.pdf; ComponentLink2Description: JLCPCB Part URL; ComponentLink2URL: https://jlcpcb.com/partdetail/C376926; ComponentLink3Description: LCSC Part URL; ComponentLink3URL: https://lcsc.com/product-detail/Multilayer-Ceramic-Capacitors-MLCC---SMD-SMT_CCTC-CCTC-TCC0805X7R105K500DT_C376926.html
footprint CAP-0805 (0805 (2012M) Capacitor)
pins: 1, 2
